# Altium footprint library Connectors Molex.PcbLib: 105 footprints (part 6 of 7)
Each footprint in its own frame and in the unit in brackets; x right, y up, seen from the top. Pads: shape width x height; smd on the part's side, far side on the other; paste and mask are expansions set on the pad; w line width, h text height; cw(c..) or ccw(c..) is an arc to the next point about the centre after c.
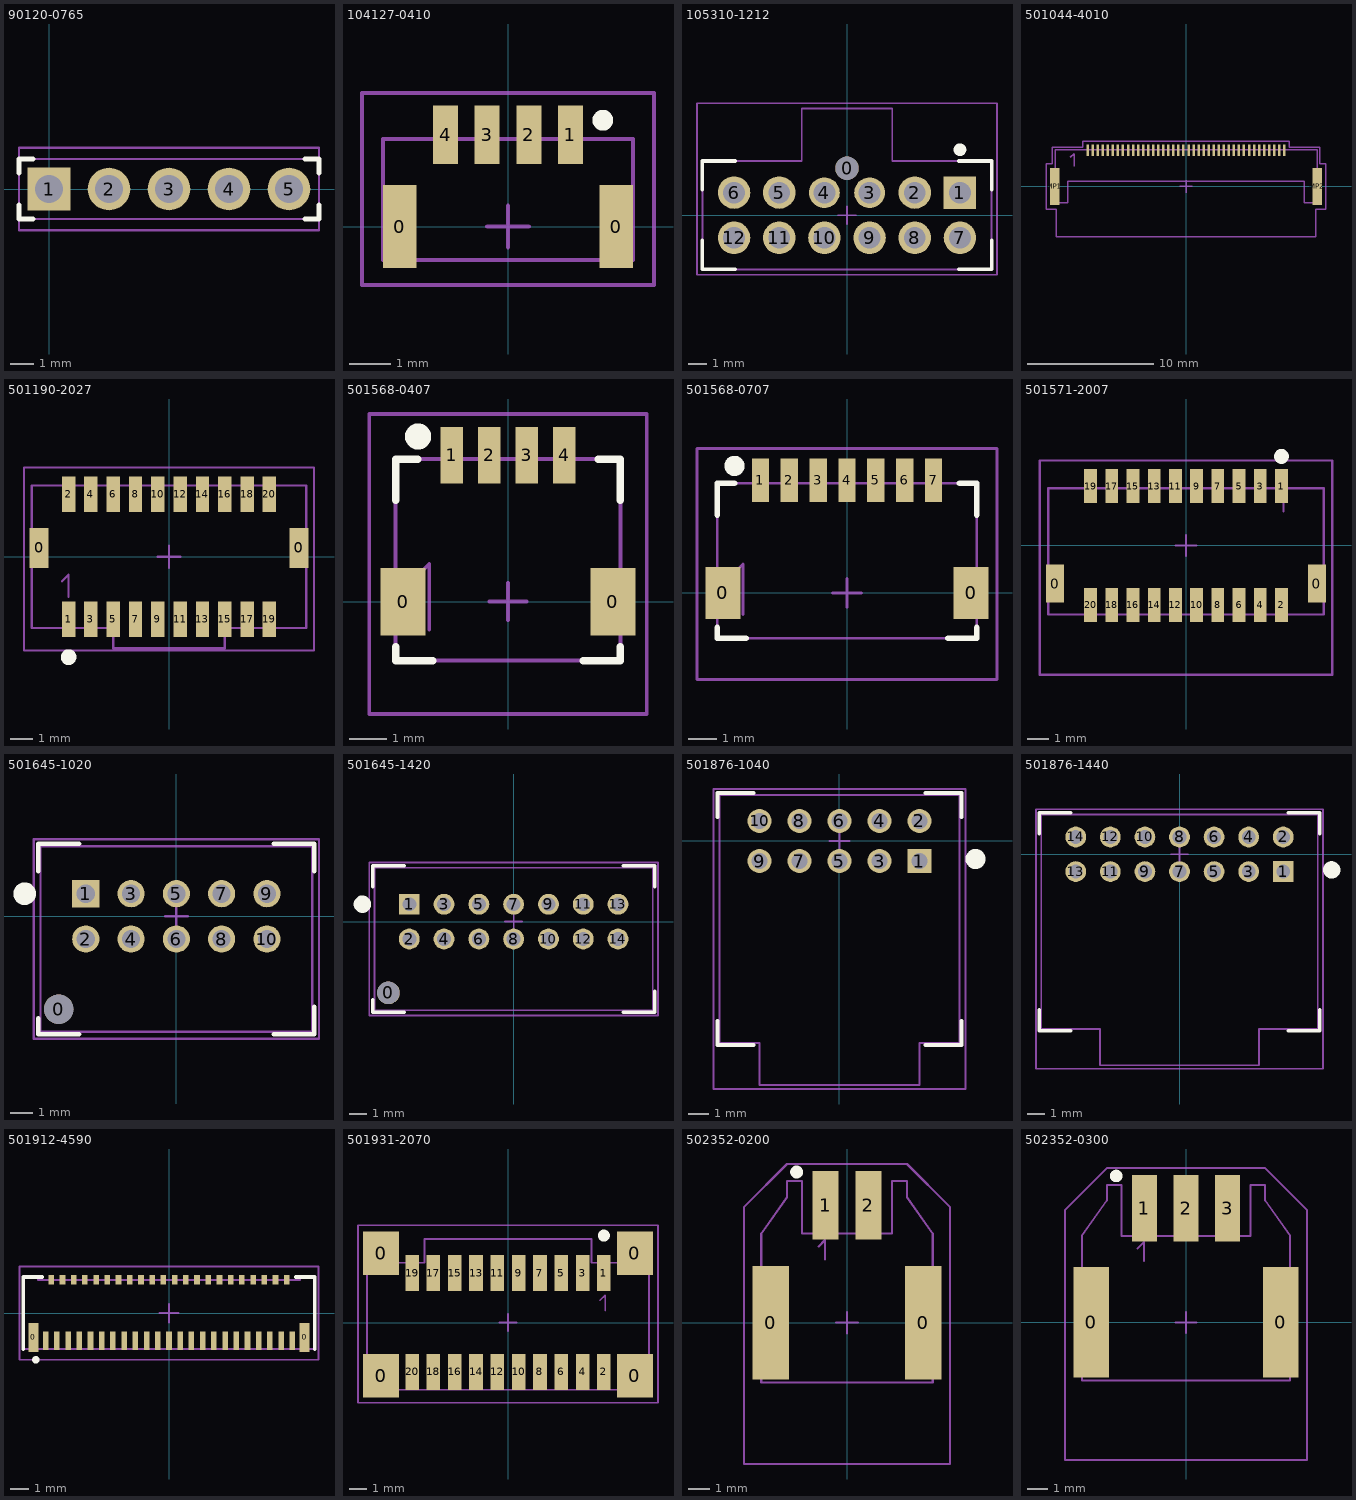
[diagram p5: the footprints below, top view; thin cyan lines are the x and y axes]

## 90120-0765 [mm] "Molex 90120-0765"
height 9.25
pads (5):
  rect 1.8x1.8 hole 1.2: 1(0,0)
  round 1.8 hole 1.2: 2(2.54,0) 3(5.08,0) 4(7.62,0) 5(10.16,0)
Top Overlay:
  lines w0.2: -1.27,-0.67 -1.27,-1.27 -0.67,-1.27 ; -1.27,0.67 -1.27,1.27 -0.67,1.27 ; 10.83,-1.27 11.43,-1.27 11.43,-0.67 ; 10.83,1.27 11.43,1.27 11.43,0.67
Mechanical 13:
  lines w0.1: -1.27,-1.27 11.43,-1.27 11.43,1.27 -1.27,1.27 -1.27,-1.27
  text "1" at -0.25,-0.67 h1.5
  text ".Designator" at 2.725,-0.525 h1.5
Mechanical 15:
  lines w0.1: -1.27,-1.75 -1.27,1.75 11.43,1.75 11.43,-1.75 -1.27,-1.75
3D body "901200765.stp": height 9.25, standoff -2.87, extent -1.27,-1.25 11.43,1.25

## 104127-0410 [mm] "IllumiMate™ 104127"
height 4
pads (6):
  rect 0.8x2 smd: 0(-2.6,0) 0(2.6,0)
  rect 0.6x1.4 smd: 1(1.5,2.2) 2(0.5,2.2) 3(-0.5,2.2) 4(-1.5,2.2)
Top Overlay:
  circle w0.25: c2.275,2.55 r0.125
Mechanical 13:
  lines w0.1: -1.65,2.1 -1.65,2.6 -1.35,2.6 -1.35,2.1 ; -0.65,2.1 -0.65,2.6 -0.35,2.6 -0.35,2.1 ; 0.35,2.1 0.35,2.6 0.65,2.6 0.65,2.1 ; 1.35,2.1 1.35,2.6 1.65,2.6 1.65,2.1 ; -3,-0.8 -3,2.1 3,2.1 3,-0.8 -3,-0.8
  text ".Designator" at -0.7,0 h1.5
Mechanical 15:
  lines w0.1: -0.5,0 0.5,0 ; 0,-0.5 0,0.5 ; -3.5,-1.4 -3.5,3.2 3.5,3.2 3.5,-1.4 -3.5,-1.4
3D body "1041270410.stp": height 4, standoff 0, extent -3,-0.8 3,2.6

## 105310-1212 [mm] "Nano-Fit™ 105310"
height 10.51
pads (13):
  round 1.3 hole 1.3 unplated: 0(0,2.6)
  rect 1.8x1.8 hole 1.2: 1(6.25,1.25)
  round 1.8 hole 1.2: 2(3.75,1.25) 5(-3.75,1.25) 6(-6.25,1.25) 7(6.25,-1.25) 8(3.75,-1.25) 9(1.25,-1.25) 10(-1.25,-1.25) 11(-3.75,-1.25) 12(-6.25,-1.25)
  round 1.7 hole 1.2: 3(1.25,1.25) 4(-1.25,1.25)
Top Overlay:
  circle w0.4: c6.25,3.625 r0.15
  lines w0.2: -8,-1.4 -8,-3 -6.2,-3 ; -8,1.4 -8,3 -6.2,3 ; 6.2,-3 8,-3 8,-1.4 ; 6.2,3 8,3 8,1.4
Mechanical 13:
  lines w0.1: -8,-3 8,-3 8,3 2.5,3 2.5,5.9 -2.5,5.9 -2.5,3 -8,3 -8,-3
  text ".Designator" at -0.725,-0.425 h1.5
Mechanical 15:
  lines w0.1: -0.5,0 0.5,0 ; 0,-0.5 0,0.5 ; -8.3,-3.3 8.3,-3.3 8.3,6.2 -8.3,6.2 -8.3,-3.3
3D body "1053101212.stp": height 10.51, standoff -3.2, extent -7.97,-2.99 7.97,5.85

## 501044-4010 [mm] "501044"
height 1.15
pads (42):
  rect 0.2x0.9 smd: 1(-7.8,2.875) 2(-7.4,2.875) 3(-7,2.875) 4(-6.6,2.875) 5(-6.2,2.875) 6(-5.8,2.875) 7(-5.4,2.875) 8(-5,2.875) 9(-4.6,2.875) 10(-4.2,2.875) 11(-3.8,2.875) 12(-3.4,2.875) 13(-3,2.875) 14(-2.6,2.875) 15(-2.2,2.875) 16(-1.8,2.875) 17(-1.4,2.875) 18(-1,2.875) 19(-0.6,2.875) 20(-0.2,2.875) 21(0.2,2.875) 22(0.6,2.875) 23(1,2.875) 24(1.4,2.875) 25(1.8,2.875) 26(2.2,2.875) 27(2.6,2.875) 28(3,2.875) 29(3.4,2.875) 30(3.8,2.875) 31(4.2,2.875) 32(4.6,2.875) 33(5,2.875) 34(5.4,2.875) 35(5.8,2.875) 36(6.2,2.875) 37(6.6,2.875) 38(7,2.875) 39(7.4,2.875) 40(7.8,2.875)
  rect 0.75x2.95 smd: MP1(-10.425,0) MP2(10.425,0)
Mechanical 13:
  lines w0.1: -9.175,2.3 -8.875,2.6 -8.875,1.6 ; -10.375,-1.3 -9.375,-1.3 -9.375,0.425 9.375,0.425 9.375,-1.3 10.375,-1.3 10.425,-1.3 10.425,2.9 -10.375,2.9 -10.375,-1.3
  text ".Designator" at -0.5,1.025 h1.5
Mechanical 15:
  lines w0.1: -0.5,0 0.5,0 ; 0,-0.5 0,0.5 ; -11.1,-1.8 -10.3,-1.8 -10.3,-4 10.3,-4 10.3,-1.8 11.1,-1.8 11.1,1.8 10.6,1.8 10.6,3.1 8.2,3.1 8.2,3.6 -8.2,3.6 -8.2,3.1 -10.6,3.1 -10.6,1.8 -11.1,1.8 -11.1,-1.8
3D body "5010444010.stp": height 1.13, standoff -0.02, extent -10.382,-1.3 10.422,2.9

## 501190-2027 [mm] "Pico-Clasp™ 501190"
height 5.43
pads (22):
  rect 0.85x1.8 smd: 0(-5.825,0.4) 0(5.825,0.4)
  rect 0.6x1.6 smd: 1(-4.5,-2.8) 2(-4.5,2.8) 3(-3.5,-2.8) 4(-3.5,2.8) 5(-2.5,-2.8) 6(-2.5,2.8) 7(-1.5,-2.8) 8(-1.5,2.8) 9(-0.5,-2.8) 10(-0.5,2.8) 11(0.5,-2.8) 12(0.5,2.8) 13(1.5,-2.8) 14(1.5,2.8) 15(2.5,-2.8) 16(2.5,2.8) 17(3.5,-2.8) 18(3.5,2.8) 19(4.5,-2.8) 20(4.5,2.8)
Top Overlay:
  circle w0.4: c-4.5,-4.5 r0.15
Mechanical 13:
  lines w0.1: -4.8,-1.1 -4.5,-0.8 -4.5,-1.8 ; -6.15,-3.2 -6.15,3.2 6.15,3.2 6.15,-3.2 2.5,-3.2 2.5,-4.1 -2.5,-4.1 -2.5,-3.2 -6.15,-3.2
  text ".Designator" at -1.275,0.2 h1.5
Mechanical 15:
  lines w0.1: -0.5,0 0.5,0 ; 0,-0.5 0,0.5 ; -6.5,-4.2 -6.5,4 6.5,4 6.5,-4.2 -6.5,-4.2
3D body "5011902027.stp": height 5.41, standoff 0, extent -6.15,-4.07 6.15,3.2

## 501568-0407 [mm] "Pico-Clasp™ 501568"
height 3.2
pads (6):
  rect 1.2x1.8 smd: 0(-2.8,0) 0(2.8,0)
  rect 0.6x1.5 smd: 1(-1.5,3.9) 2(-0.5,3.9) 3(0.5,3.9) 4(1.5,3.9)
Top Overlay:
  circle w0.4: c-2.4,4.4 r0.15
  lines w0.2: -3,-1.2 -3,-1.575 -2,-1.575 ; -3,2.7 -3,3.8 -2.4,3.8 ; 2,-1.575 3,-1.575 3,-1.2 ; 2.4,3.8 3,3.8 3,2.7
Mechanical 13:
  lines w0.1: -2.6,0.5 -2.1,1 -2.1,-0.75 ; -1.65,3.8 -1.65,4.3 -1.35,4.3 -1.35,3.8 ; -0.65,3.8 -0.65,4.3 -0.35,4.3 -0.35,3.8 ; 0.35,3.8 0.35,4.3 0.65,4.3 0.65,3.8 ; 1.35,3.8 1.35,4.3 1.65,4.3 1.65,3.8 ; -3,-1.575 3,-1.575 3,3.8 -3,3.8 -3,-1.575
Mechanical 15:
  lines w0.1: -0.5,0 0.5,0 ; 0,-0.5 0,0.5 ; -3.7,-3 3.7,-3 3.7,5 -3.7,5 -3.7,-3
3D body "5015680407.stp": height 3.2, standoff 0, extent -3,-1.575 3,4.325

## 501568-0707 [mm] "Pico-Clasp™ 501568"
height 4.7
pads (9):
  rect 1.2x1.8 smd: 0(-4.3,0) 0(4.3,0)
  rect 0.6x1.5 smd: 1(-3,3.9) 2(-2,3.9) 3(-1,3.9) 4(0,3.9) 5(1,3.9) 6(2,3.9) 7(3,3.9)
Top Overlay:
  circle w0.4: c-3.9,4.4 r0.15
  lines w0.2: -4.5,-1.2 -4.5,-1.575 -3.5,-1.575 ; -4.5,2.7 -4.5,3.8 -3.9,3.8 ; 3.5,-1.575 4.5,-1.575 4.5,-1.2 ; 3.9,3.8 4.5,3.8 4.5,2.7
Mechanical 13:
  lines w0.1: -4.1,0.5 -3.6,1 -3.6,-0.75 ; -3.15,3.8 -3.15,4.3 -2.85,4.3 -2.85,3.8 ; -2.15,3.8 -2.15,4.3 -1.85,4.3 -1.85,3.8 ; -1.15,3.8 -1.15,4.3 -0.85,4.3 -0.85,3.8 ; -0.15,3.8 -0.15,4.3 0.15,4.3 0.15,3.8 ; 0.85,3.8 0.85,4.3 1.15,4.3 1.15,3.8 ; 1.85,3.8 1.85,4.3 2.15,4.3 2.15,3.8 ; 2.85,3.8 2.85,4.3 3.15,4.3 3.15,3.8 ; -4.5,-1.575 -4.5,3.8 4.5,3.8 4.5,-1.575 -4.5,-1.575
Mechanical 15:
  lines w0.1: -0.5,0 0.5,0 ; 0,-0.5 0,0.5 ; -5.2,-3 -5.2,5 5.2,5 5.2,-3 -5.2,-3
3D body "5015680707.stp": height 4.7, standoff 0, extent -4.5,-1.575 4.5,4.325

## 501571-2007 [mm] "Pico-Clasp™ 501571"
height 8.25
pads (22):
  rect 0.85x1.8 smd: 0(-6.175,-1.8) 0(6.175,-1.8)
  rect 0.6x1.6 smd: 1(4.5,2.8) 2(4.5,-2.8) 3(3.5,2.8) 4(3.5,-2.8) 5(2.5,2.8) 6(2.5,-2.8) 7(1.5,2.8) 8(1.5,-2.8) 9(0.5,2.8) 10(0.5,-2.8) 11(-0.5,2.8) 12(-0.5,-2.8) 13(-1.5,2.8) 14(-1.5,-2.8) 15(-2.5,2.8) 16(-2.5,-2.8) 17(-3.5,2.8) 18(-3.5,-2.8) 19(-4.5,2.8) 20(-4.5,-2.8)
Top Overlay:
  circle w0.4: c4.5,4.2 r0.15
Mechanical 13:
  lines w0.1: -4.6,2.7 -4.6,3.2 -4.4,3.2 -4.4,2.7 ; -3.6,2.7 -3.6,3.2 -3.4,3.2 -3.4,2.7 ; -2.6,2.7 -2.6,3.2 -2.4,3.2 -2.4,2.7 ; -1.6,2.7 -1.6,3.2 -1.4,3.2 -1.4,2.7 ; -0.6,2.7 -0.6,3.2 -0.4,3.2 -0.4,2.7 ; 0.4,2.7 0.4,3.2 0.6,3.2 0.6,2.7 ; 1.4,2.7 1.4,3.2 1.6,3.2 1.6,2.7 ; 2.4,2.7 2.4,3.2 2.6,3.2 2.6,2.7 ; 3.4,2.7 3.4,3.2 3.6,3.2 3.6,2.7 ; 4.3,2.3 4.6,2.6 4.6,1.6 ; 4.4,2.7 4.4,3.2 4.6,3.2 4.6,2.7 ; -6.5,2.7 6.5,2.7 6.5,-3.25 -6.5,-3.25 -6.5,2.7 ; -6.5,2.7 -6.5,2.7
  text ".Designator" at -1.275,0.2 h1.5
Mechanical 15:
  lines w0.1: -0.5,0 0.5,0 ; 0,-0.5 0,0.5 ; -6.9,-6.1 -6.9,4 6.9,4 6.9,-6.1 -6.9,-6.1
3D body "5015712007.stp": height 8.25, standoff 0, extent -6.5,-3.25 6.5,3.25

## 501645-1020 [mm] "iGrid™ 501645"
height 12
pads (11):
  round 1.3 hole 1.3 unplated: 0(-5.2,-4.1)
  rect 1.2x1.2 hole 0.8: 1(-4,1)
  round 1.2 hole 0.8: 2(-4,-1) 3(-2,1) 4(-2,-1) 5(0,1) 6(0,-1) 7(2,1) 8(2,-1) 9(4,1) 10(4,-1)
Top Overlay:
  circle w0.5: c-6.7,1 r0.25
  lines w0.2: -6.1,-4.5 -6.1,-5.2 -4.3,-5.2 ; -6.1,2 -6.1,3.2 -4.3,3.2 ; 4.3,-5.2 6.1,-5.2 6.1,-4 ; 4.3,3.2 6.1,3.2 6.1,2
Mechanical 13:
  lines w0.1: 6,-5.1 -6,-5.1 -6,3.1 6,3.1 6,-5.1
  text "1" at -4,0.5 h1
  text ".Designator" at -2.075,-0.35 h1.5
Mechanical 15:
  lines w0.1: -0.5,0 0.5,0 ; 0,-0.5 0,0.5 ; -6.3,-5.4 -6.3,3.4 6.3,3.4 6.3,-5.4 -6.3,-5.4
3D body "5016451020.stp": height 12, standoff -3.2, extent -6,-5.1 6,3.1

## 501645-1420 [mm] "iGrid™ 501645"
height 12
pads (15):
  round 1.3 hole 1.3 unplated: 0(-7.2,-4.1)
  rect 1.2x1.2 hole 0.8: 1(-6,1)
  round 1.2 hole 0.8: 2(-6,-1) 3(-4,1) 4(-4,-1) 5(-2,1) 6(-2,-1) 7(0,1) 8(0,-1) 9(2,1) 10(2,-1) 11(4,1) 12(4,-1) 13(6,1) 14(6,-1)
Top Overlay:
  circle w0.5: c-8.7,1 r0.25
  lines w0.2: -8.1,-4.5 -8.1,-5.2 -6.3,-5.2 ; -8.1,2 -8.1,3.2 -6.3,3.2 ; 6.3,-5.2 8.1,-5.2 8.1,-4 ; 6.3,3.2 8.1,3.2 8.1,2
Mechanical 13:
  lines w0.1: -8,-5.1 8,-5.1 8,3.1 -8,3.1 -8,-5.1
  text "1" at -6,0.5 h1
  text ".Designator" at -2.075,-0.35 h1.5
Mechanical 15:
  lines w0.1: -0.5,0 0.5,0 ; 0,-0.5 0,0.5 ; -8.3,-5.4 -8.3,3.4 8.3,3.4 8.3,-5.4 -8.3,-5.4
3D body "5016451420.stp": height 12, standoff -3.2, extent -8,-5.1 8,3.1

## 501876-1040 [mm] "iGrid™ 501876"
height 8.3
pads (10):
  rect 1.2x1.2 hole 0.8: 1(4,-1)
  round 1.2 hole 0.8: 2(4,1) 3(2,-1) 4(2,1) 5(0,-1) 6(0,1) 7(-2,-1) 8(-2,1) 9(-4,-1) 10(-4,1)
Top Overlay:
  circle w0.5: c6.8,-0.9 r0.25
  lines w0.2: -6.1,-9 -6.1,-10.2 -4.3,-10.2 ; -6.1,1.2 -6.1,2.4 -4.3,2.4 ; 4.3,-10.2 6.1,-10.2 6.1,-9 ; 4.3,2.4 6.1,2.4 6.1,1.2
Mechanical 13:
  lines w0.1: -6,-10.1 -4,-10.1 -4,-12.2 4,-12.2 4,-10.1 6,-10.1 6,2.3 -6,2.3 -6,-10.1
  text "1" at 4,-1.4 h1
  text ".Designator" at -2.075,-0.35 h1.5
Mechanical 15:
  lines w0.1: -0.5,0 0.5,0 ; 0,-0.5 0,0.5 ; -6.3,-12.4 -6.3,2.6 6.3,2.6 6.3,-12.4 -6.3,-12.4
3D body "5018761040.stp": height 8.3, standoff -3.2, extent -6,-12.2 6,2.3

## 501876-1440 [mm] "iGrid™ 501876"
height 8.3
pads (14):
  rect 1.2x1.2 hole 0.8: 1(6,-1)
  round 1.2 hole 0.8: 2(6,1) 3(4,-1) 4(4,1) 5(2,-1) 6(2,1) 7(0,-1) 8(0,1) 9(-2,-1) 10(-2,1) 11(-4,-1) 12(-4,1) 13(-6,-1) 14(-6,1)
Top Overlay:
  circle w0.5: c8.8,-0.9 r0.25
  lines w0.2: -8.1,-9 -8.1,-10.2 -6.3,-10.2 ; -8.1,1.2 -8.1,2.4 -6.3,2.4 ; 6.3,-10.2 8.1,-10.2 8.1,-9 ; 6.3,2.4 8.1,2.4 8.1,1.2
Mechanical 13:
  lines w0.1: -8,-10.1 -4.6,-10.1 -4.6,-12.2 4.6,-12.2 4.6,-10.1 8,-10.1 8,2.3 -8,2.3 -8,-10.1
  text "1" at 6,-1.4 h1
  text ".Designator" at -2.075,-0.35 h1.5
Mechanical 15:
  lines w0.1: -0.5,0 0.5,0 ; 0,-0.5 0,0.5 ; -8.3,-12.4 -8.3,2.6 8.3,2.6 8.3,-12.4 -8.3,-12.4
3D body "5018761440.stp": height 8.3, standoff -3.2, extent -8,-12.2 8,2.3

## 501912-4590 [mm] "CONN FPC .3MM 45POS R/A SMD"
height 1.8
pads (47):
  rect 0.52x1.55 smd: 0(-7.25,-1.3) 0(7.25,-1.3)
  rect 0.3x1 smd: 1(-6.6,-1.475) 3(-6,-1.475) 5(-5.4,-1.475) 7(-4.8,-1.475) 9(-4.2,-1.475) 11(-3.6,-1.475) 13(-3,-1.475) 15(-2.4,-1.475) 17(-1.8,-1.475) 19(-1.2,-1.475) 21(-0.6,-1.475) 23(0,-1.475) 25(0.6,-1.475) 27(1.2,-1.475) 29(1.8,-1.475) 31(2.4,-1.475) 33(3,-1.475) 35(3.6,-1.475) 37(4.2,-1.475) 39(4.8,-1.475) 41(5.4,-1.475) 43(6,-1.475) 45(6.6,-1.475)
  rect 0.3x0.5 smd: 2(-6.3,1.775) 4(-5.7,1.775) 6(-5.1,1.775) 8(-4.5,1.775) 10(-3.9,1.775) 12(-3.3,1.775) 14(-2.7,1.775) 16(-2.1,1.775) 18(-1.5,1.775) 20(-0.9,1.775) 22(-0.3,1.775) 24(0.3,1.775) 26(0.9,1.775) 28(1.5,1.775) 30(2.1,1.775) 32(2.7,1.775) 34(3.3,1.775) 36(3.9,1.775) 38(4.5,1.775) 40(5.1,1.775) 42(5.7,1.775) 44(6.3,1.775)
Top Overlay:
  circle w0.2: c-7.125,-2.5 r0.1
  lines w0.2: -7.8,-1.925 -7.8,1.925 -6.8,1.925 ; 6.8,1.925 7.8,1.925 7.8,-1.925
Mechanical 13:
  lines w0.1: -7,1.925 -7.8,1.925 -7.8,-1.925 7.8,-1.925 7.8,1.925 7,1.925 7,1.775 -7,1.775 -7,1.925 ; -7,1.925 -7,1.925
  text ".Designator" at -2,-0.25 h1.5
  text "1" at -6.75,-1.275 h1
Mechanical 15:
  lines w0.1: -0.5,0 0.5,0 ; 0,-0.5 0,0.5 ; -8,-2.5 8,-2.5 8,2.5 -8,2.5 -8,-2.5
3D body "5019124590.stp": height 1.75, standoff -0.05, extent -7.8,-1.925 7.8,1.925

## 501931-2070 [mm] "Duo-Clasp™ 501931"
height 8.8
pads (24):
  rect 2.1x2.55 smd: 0(-7.45,-3.125) 0(-7.45,4.075) 0(7.45,-3.125) 0(7.45,4.075)
  rect 0.8x2.1 smd: 1(5.625,2.9) 2(5.625,-2.9) 3(4.375,2.9) 4(4.375,-2.9) 5(3.125,2.9) 6(3.125,-2.9) 7(1.875,2.9) 8(1.875,-2.9) 9(0.625,2.9) 10(0.625,-2.9) 11(-0.625,2.9) 12(-0.625,-2.9) 13(-1.875,2.9) 14(-1.875,-2.9) 15(-3.125,2.9) 16(-3.125,-2.9) 17(-4.375,2.9) 18(-4.375,-2.9) 19(-5.625,2.9) 20(-5.625,-2.9)
Top Overlay:
  circle w0.4: c5.625,5.1 r0.15
Mechanical 13:
  lines w0.1: 5.4,1.3 5.7,1.6 5.7,0.7 ; -8.275,-3.95 8.275,-3.95 8.275,4.9 6.7,4.9 6.7,3.5 4.9,3.5 4.9,4.9 -4.9,4.9 -4.9,3.5 -6.7,3.5 -6.7,4.9 -8.275,4.9 -8.275,-3.95
  text ".Designator" at -1.2,-0.3 h1.5
Mechanical 15:
  lines w0.1: -0.5,0 0.5,0 ; 0,-0.5 0,0.5 ; -8.8,-4.7 -8.8,5.7 8.8,5.7 8.8,-4.7 -8.8,-4.7
3D body "5019312070.stp": height 8.8, standoff -0.03, extent -8.275,-3.95 8.275,4.9

## 502352-0200 [mm] "DuraClik™ 502352"
height 6.4
pads (4):
  rect 1.7x5.3 smd: 0(-3.55,0) 0(3.55,0)
  rect 1.2x3.2 smd: 1(-1,5.48) 2(1,5.48)
Top Overlay:
  circle w0.3: c-2.35,7.025 r0.15
Mechanical 13:
  lines w0.1: -1.325,3.55 -1.025,3.85 -1.025,2.95 ; -4,-2.8 -4,4.15 -2.8,5.85 -2.8,6.6 -2.1,6.6 -2.1,4.15 -1.25,4.15 -1.25,6.6 -0.75,6.6 -0.75,4.15 0.75,4.15 0.75,6.6 1.25,6.6 1.25,4.15 2.1,4.15 2.1,6.6 2.8,6.6 2.8,5.85 4,4.15 4,-2.8 -4,-2.8
  text ".Designator" at -1.3,0.3 h1.5
Mechanical 15:
  lines w0.1: -0.5,0 0.5,0 ; 0,-0.5 0,0.5 ; -4.8,-6.6 -4.8,5.4 -2.8,7.4 2.8,7.4 4.8,5.4 4.8,-6.6 -4.8,-6.6
3D body "5023520200.stp": height 6.4, standoff 0, extent -4,-2.8 4,6.6

## 502352-0300 [mm] "DuraClik™ 502352"
height 6.4
pads (5):
  rect 1.7x5.3 smd: 0(-4.55,0) 0(4.55,0)
  rect 1.2x3.2 smd: 1(-2,5.48) 2(0,5.48) 3(2,5.48)
Top Overlay:
  circle w0.3: c-3.35,7.025 r0.15
Mechanical 13:
  lines w0.1: -2.325,3.55 -2.025,3.85 -2.025,2.95 ; -5,-2.8 -5,4.15 -3.8,5.85 -3.8,6.6 -3.1,6.6 -3.1,4.15 -2.25,4.15 -2.25,6.6 -1.75,6.6 -1.75,4.15 -0.25,4.15 -0.25,6.6 0.25,6.6 0.25,4.15 1.75,4.15 1.75,6.6 2.25,6.6 2.25,4.15 3.1,4.15 3.1,6.6 3.8,6.6 3.8,5.85 5,4.15 5,-2.8 -5,-2.8
  text ".Designator" at -1.3,0.3 h1.5
Mechanical 15:
  lines w0.1: -0.5,0 0.5,0 ; 0,-0.5 0,0.5 ; -5.8,-6.6 -5.8,5.4 -3.8,7.4 3.8,7.4 5.8,5.4 5.8,-6.6 -5.8,-6.6
3D body "5023520300.stp": height 6.4, standoff 0, extent -5,-2.8 5,6.6